# Altium integrated library ICL_komponenty_v1.IntLib: 293 symbols (part 1 of 2)
Pins are listed as number, name and electrical type; pins without a type are passive.

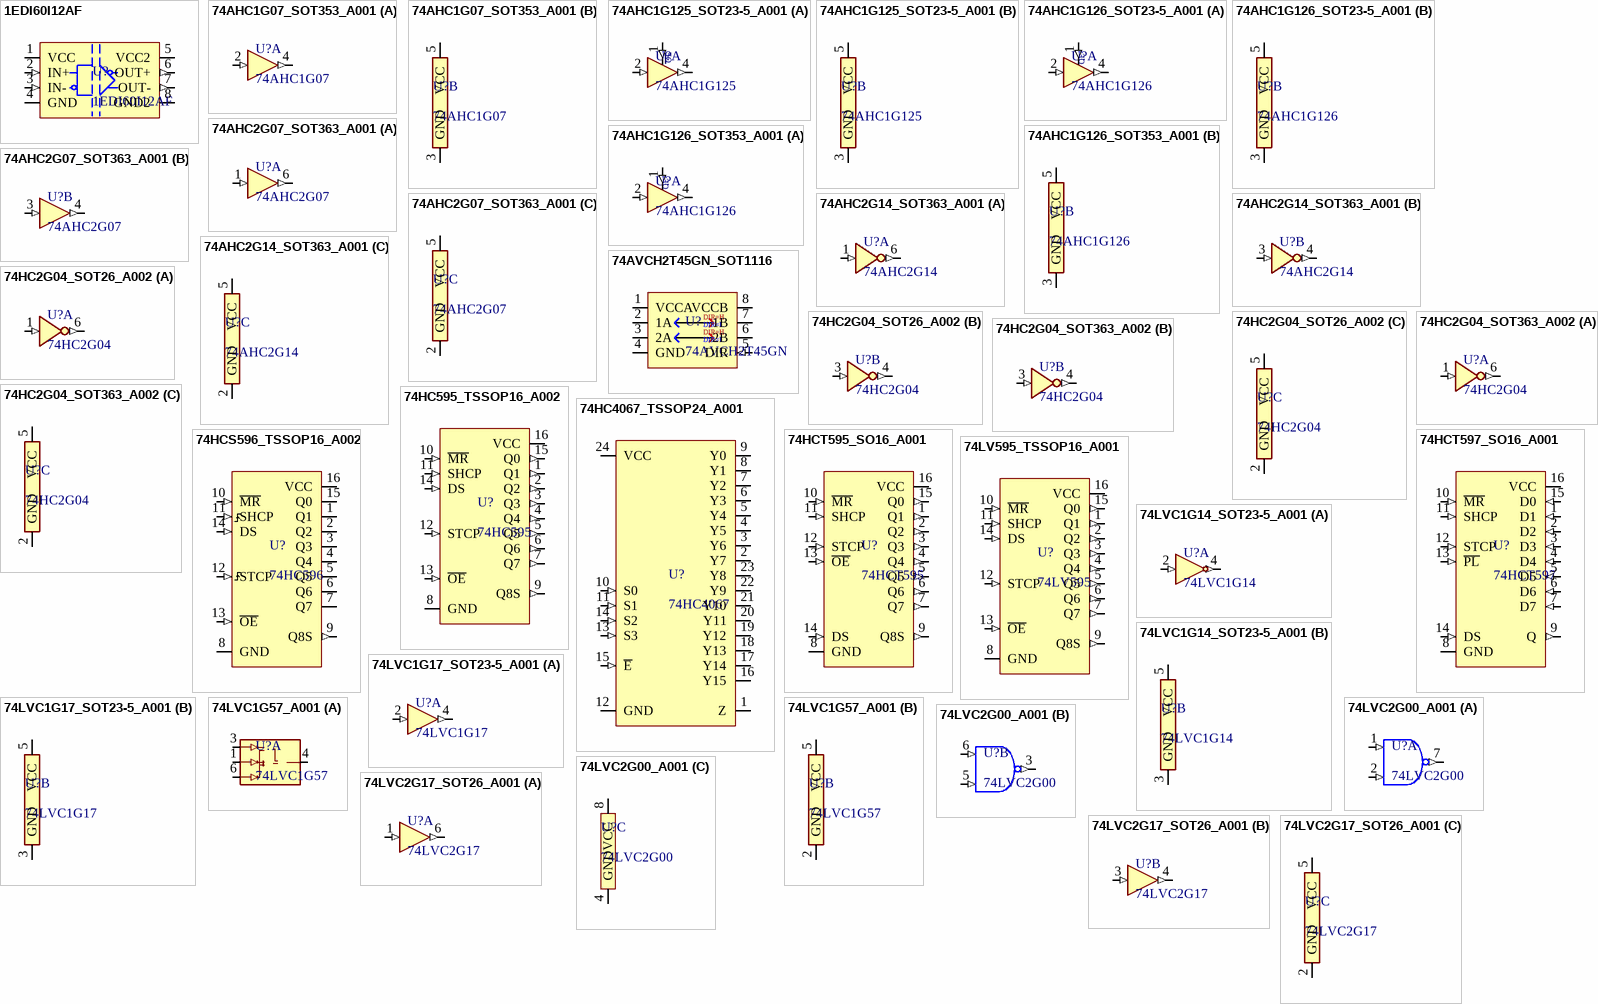
[diagram p0: symbols 1EDI60I12AF to 74LVC2G17_SOT26_A001]

## 1EDI60I12AF
designator U?
Isolated gate driver 6A; ICLN: IC_1EDI60I12AF_SO8_A001
footprint SO-8
pins: 1 VCC (power), 2 IN+ (in), 3 IN- (in), 4 GND (power), 5 VCC2 (power), 6 OUT+ (out), 7 OUT- (out), 8 GND2 (power)

## 74AHC1G07_SOT353_A001
designator U?, comment 74AHC1G07
buffer OC; ITSN: IC_74AHC1G126_SOT353_A001
footprint SOT353
part A pins: 2 A1 (in), 4 Y1 (out)
part B pins: 3 GND (power), 5 VCC (power)

## 74AHC1G125_SOT23-5_A001
designator U?, comment 74AHC1G125
buffer with enable; ICLN: IC_74AHC1G125_SOT23-5_A001
footprint SOT-23-5
part A pins: 1 OE (in), 2 A1 (in), 4 Y1 (out)
part B pins: 3 GND (power), 5 VCC (power)

## 74AHC1G126_SOT23-5_A001
designator U?, comment 74AHC1G126
buffer with enable; ICLN: IC_74AHC1G126_SOT23-5_A001
footprint SOT-23-5
part A pins: 1 OE (in), 2 A1 (in), 4 Y1 (out)
part B pins: 3 GND (power), 5 VCC (power)

## 74AHC1G126_SOT353_A001
designator U?, comment 74AHC1G126
buffer with enable; ITSN: IC_74AHC1G126_SOT353_A001
footprint SOT353
part A pins: 1 OE (in), 2 A1 (in), 4 Y1 (out)
part B pins: 3 GND (power), 5 VCC (power)

## 74AHC2G07_SOT363_A001
designator U?, comment 74AHC2G07
2x buffer OC; ITSN: IC_74AHC2G07_SOT363_A001
footprint SOT363
part A pins: 1 A1 (in), 6 Y1 (out)
part B pins: 3 A2 (in), 4 Y2 (out)
part C pins: 2 GND (power), 5 VCC (power)

## 74AHC2G14_SOT363_A001
designator U?, comment 74AHC2G14
2x inventer; ICLN: IC_74AHC2G14_SOT363_A001
footprint SOT363
part A pins: 1 A1 (in), 6 Y1 (out)
part B pins: 3 A2 (in), 4 Y2 (out)
part C pins: 2 GND (power), 5 VCC (power)

## 74AVCH2T45GN_SOT1116
designator U?, comment 74AVCH2T45GN
2 bit translator; ICLN: IC_74AVCH2T45GN_SOT1116_A001
footprint SOT-1116 (NXP SOT 1116)
pins: 1 VCCA (power), 2 1A (io), 3 2A (io), 4 GND (power), 5 DIR (in), 6 2B (io), 7 1B (io), 8 VCCB (power)
text: DIR=H; DIR=L

## 74HC2G04_SOT26_A002
designator U?, comment 74HC2G04
dual inverter; ICLN: IC_74HC2G04_SOT26_A002
footprint SOT23-6 (Zetex)
part A pins: 1 A1 (in), 6 Y1 (out)
part B pins: 3 A2 (in), 4 Y2 (out)
part C pins: 2 GND (power), 5 VCC (power)

## 74HC2G04_SOT363_A002
designator U?, comment 74HC2G04
dual inverter; ICLN: IC_74HC2G04_SOT26_A002
footprint SOT363
part A pins: 1 A1 (in), 6 Y1 (out)
part B pins: 3 A2 (in), 4 Y2 (out)
part C pins: 2 GND (power), 5 VCC (power)

## 74HC595_TSSOP16_A002
designator U?, comment 74HC595
8-b serial to parallel shift register; ICLN: IC_74HC595_TSSOP16_A002
footprint TSSOP-16
pins: 1 Q1 (out), 2 Q2 (out), 3 Q3 (out), 4 Q4 (out), 5 Q5 (out), 6 Q6 (out), 7 Q7 (out), 8 GND (power), 9 Q8S (out), 10 ~{MR} (in), 11 SHCP (in), 12 STCP (in), 13 ~{OE} (in), 14 DS (in), 15 Q0 (out), 16 VCC (power)

## 74HC4067_TSSOP24_A001
designator U?, comment 74HC4067
1:16 analog multiplekser; ICLN: IC_74HC4067_TSSOP24_A001
footprint TSSOP-24
pins: 1 Z, 2 Y7, 3 Y6, 4 Y5, 5 Y4, 6 Y3, 7 Y2, 8 Y1, 9 Y0, 10 S0 (in), 11 S1 (in), 12 GND (power), 13 S3 (in), 14 S2 (in), 15 ~{E} (in), 16 Y15, 17 Y14, 18 Y13, 19 Y12, 20 Y11, 21 Y10, 22 Y9, 23 Y8, 24 VCC (power)

## 74HCS596_TSSOP16_A002
designator U?, comment 74HC596
8-b serial to parallel shift register with open drain output; ICLN: IC_74HCS596_TSSOP16_A002
footprint TSSOP-16
pins: 1 Q1 (oc), 2 Q2 (oc), 3 Q3 (oc), 4 Q4 (oc), 5 Q5 (oc), 6 Q6 (oc), 7 Q7 (oc), 8 GND (power), 9 Q8S (out), 10 ~{MR} (in), 11 SHCP (in), 12 STCP (in), 13 ~{OE} (in), 14 DS (in), 15 Q0 (oc), 16 VCC (power)

## 74HCT595_SO16_A001
designator U?, comment 74HCT595
8-b serial to parallel shift register; ITSN: IC_74HCT595_SO16_A001
footprint SO-16 (SOIC, 16-Leads, Body 10,0x4,0mm (max), Pitch 1,27mm, IPC Low Density)
pins: 1 Q1 (out), 2 Q2 (out), 3 Q3 (out), 4 Q4 (out), 5 Q5 (out), 6 Q6 (out), 7 Q7 (out), 8 GND (power), 9 Q8S (out), 10 ~{MR} (in), 11 SHCP (in), 12 STCP (in), 13 ~{OE} (in), 14 DS (in), 15 Q0 (out), 16 VCC (power)

## 74HCT597_SO16_A001
designator U?, comment 74HCT597
8-b parallel  to serial shift register; ITSN: IC_74HCT597_SO16_A001
footprint SO-16 (SOIC, 16-Leads, Body 10,0x4,0mm (max), Pitch 1,27mm, IPC Low Density)
pins: 1 D1 (in), 2 D2 (in), 3 D3 (in), 4 D4 (in), 5 D5 (in), 6 D6 (in), 7 D7 (in), 8 GND (power), 9 Q (out), 10 ~{MR} (in), 11 SHCP (in), 12 STCP (in), 13 ~{PL} (in), 14 DS (in), 15 D0 (in), 16 VCC (power)

## 74LV595_TSSOP16_A001
designator U?, comment 74LV595
8-b serial to parallel shift register; ICLN: IC_74LV595_TSSOP16_A001
footprint TSSOP-16
pins: 1 Q1 (out), 2 Q2 (out), 3 Q3 (out), 4 Q4 (out), 5 Q5 (out), 6 Q6 (out), 7 Q7 (out), 8 GND (power), 9 Q8S (out), 10 ~{MR} (in), 11 SHCP (in), 12 STCP (in), 13 ~{OE} (in), 14 DS (in), 15 Q0 (out), 16 VCC (power)

## 74LVC1G14_SOT23-5_A001
designator U?, comment 74LVC1G14
inventer; ICLN: IC_74LVC1G14_SOT23-5_A001
footprint SOT-23-5
part A pins: 2 A1 (in), 4 Y1 (out)
part B pins: 3 GND (power), 5 VCC (power)

## 74LVC1G17_SOT23-5_A001
designator U?, comment 74LVC1G17
buffer; ICLN: IC_74LVC1G17_SOT23-5_A001
footprint SOT-23-5
part A pins: 2 A1 (in), 4 Y1 (out)
part B pins: 3 GND (power), 5 VCC (power)

## 74LVC1G57_A001
designator U?, comment 74LVC1G57
multiple function gate; ITSN: IC_74LVC1G57GW_SOT363_A001
footprint SOT363
part A pins: 1 B, 3 A, 4 Y, 6 C
part B pins: 2 GND (power), 5 VCC (power)

## 74LVC2G00_A001
designator U?, comment 74LVC2G00
MAND GATE; ITSN: IC_74LVC2G00_VSSOP-8_A001
footprint VSSOP-8
part A pins: 1 A1 (in), 2 B1 (in), 7 OUT_1 (out)
part B pins: 3 OUT_2 (out), 5 B2 (in), 6 A2 (in)
part C pins: 4 GND (power), 8 VCC (power)

## 74LVC2G17_SOT26_A001
designator U?, comment 74LVC2G17
buffer with shmitt; ITSN: IC_74LVC2G17_SOT26_A001
footprint SOT23-6 (Zetex)
part A pins: 1 A1 (in), 6 Y1 (out)
part B pins: 3 A2 (in), 4 Y2 (out)
part C pins: 2 GND (power), 5 VCC (power)

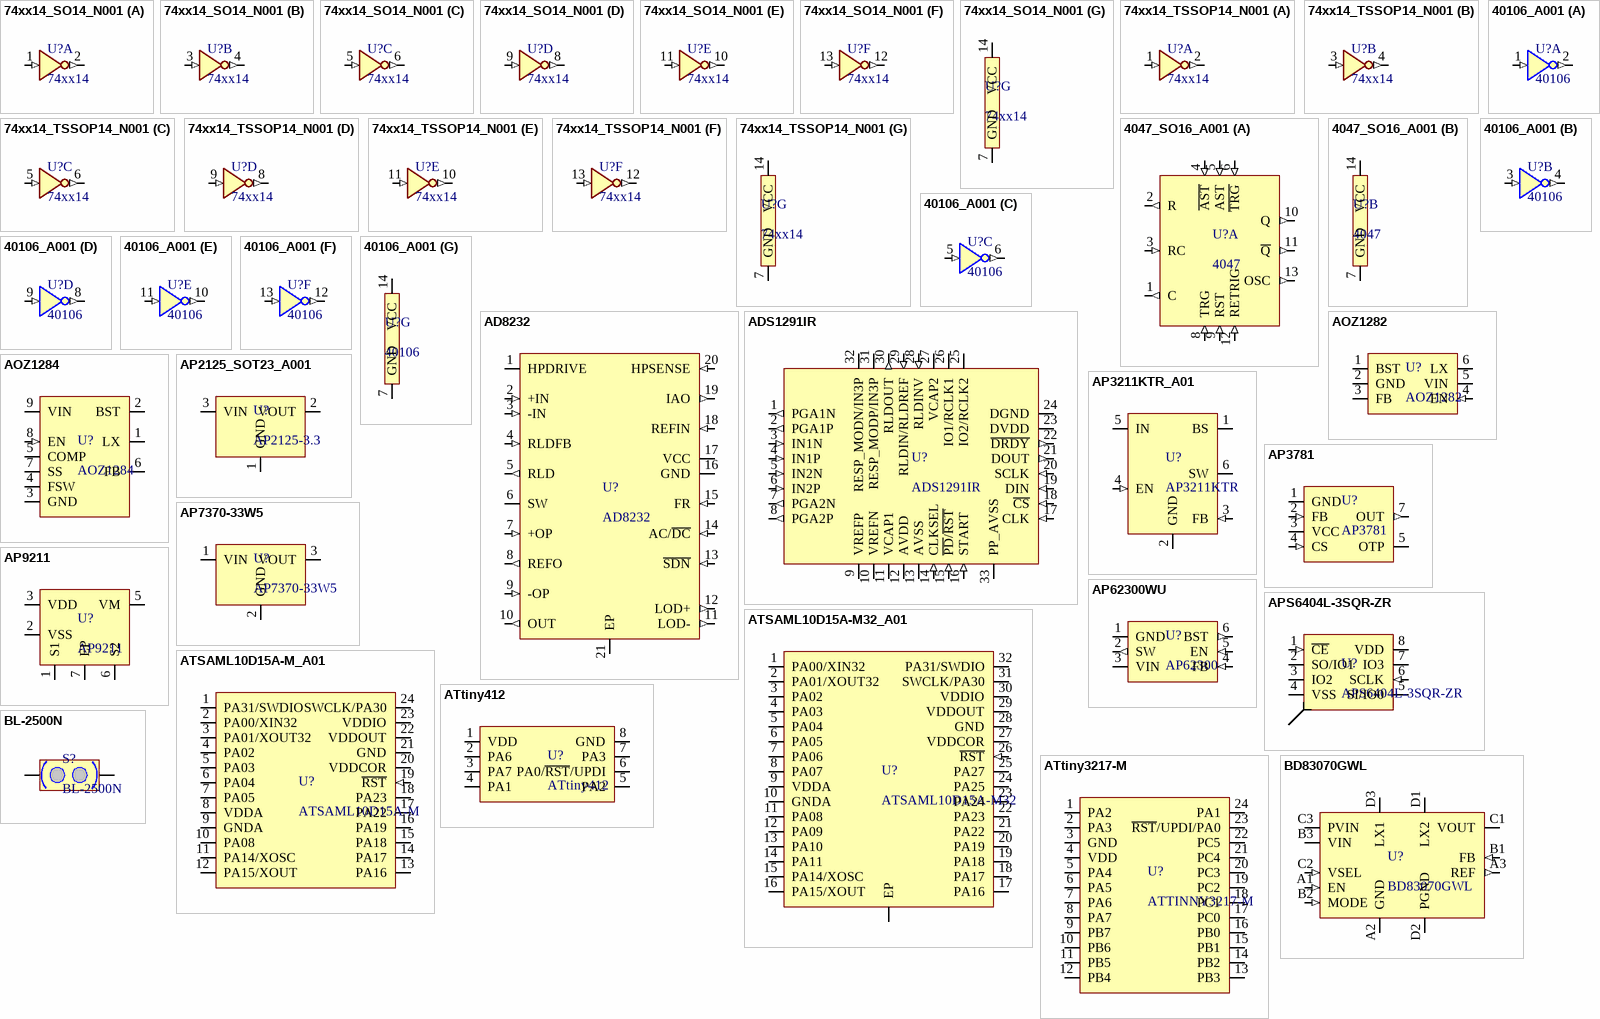
[diagram p1: symbols 74xx14_SO14_N001 to BL-2500N]

## 74xx14_SO14_N001
designator U?, comment 74xx14
6 x inverter SO14; ICLN: IC_74xx14_SO-14_N001
footprint SO-14
part A pins: 1 A1 (in), 2 ~{Y1} (out)
part B pins: 3 A2 (in), 4 ~{Y2} (out)
part C pins: 5 A3 (in), 6 ~{Y3} (out)
part D pins: 8 ~{Y4} (out), 9 A4 (in)
part E pins: 10 ~{Y5} (out), 11 A5 (in)
part F pins: 12 ~{Y6} (out), 13 A6 (in)
part G pins: 7 GND (power), 14 VCC (power)

## 74xx14_TSSOP14_N001
designator U?, comment 74xx14
6 x inverter SO14; ICLN: IC_74xx14_TSSOP-14_N001
footprint TSSOP-14
part A pins: 1 A1 (in), 2 ~{Y1} (out)
part B pins: 3 A2 (in), 4 ~{Y2} (out)
part C pins: 5 A3 (in), 6 ~{Y3} (out)
part D pins: 8 ~{Y4} (out), 9 A4 (in)
part E pins: 10 ~{Y5} (out), 11 A5 (in)
part F pins: 12 ~{Y6} (out), 13 A6 (in)
part G pins: 7 GND (power), 14 VCC (power)

## 4047_SO16_A001
designator U?, comment 4047
monostable/astable multivibrator; ICLN: 4047_SO14_A001
footprint SO-14
part A pins: 1 C (out), 2 R (out), 3 RC (in), 4 ~{AST} (in), 5 AST (in), 6 ~{TRG} (in), 8 TRG (in), 9 RST (in), 10 Q (out), 11 ~{Q} (out), 12 RETRIG (in), 13 OSC (out)
part B pins: 7 GND (power), 14 VCC (power)

## 40106_A001
designator U?, comment 40106
6 x inverter; ITSN: IC_40106_SO-16_A001
footprint SO-14
part A pins: 1 A1 (in), 2 ~{Y1} (out)
part B pins: 3 A2 (in), 4 ~{Y2} (out)
part C pins: 5 A3 (in), 6 ~{Y3} (out)
part D pins: 8 ~{Y4} (out), 9 A4 (in)
part E pins: 10 ~{Y5} (out), 11 A5 (in)
part F pins: 12 ~{Y6} (out), 13 A6 (in)
part G pins: 7 GND (power), 14 VCC (power)

## AD8232
designator U?
Single-Lead, Heart Rate Monitor Front End; ICLN: IC_AD8232ACPZ_QFN-20_A001
footprint QFN20_AD (AD8232)
pins: 1 HPDRIVE, 2 +IN (in), 3 -IN (in), 4 RLDFB (in), 5 RLD (out), 6 SW, 7 +OP (in), 8 REFO (out), 9 -OP (in), 10 OUT (out), 11 LOD- (out), 12 LOD+ (out), 13 ~{SDN} (in), 14 AC/~{DC} (in), 15 FR (in), 16 GND (power), 17 VCC (power), 18 REFIN (in), 19 IAO (out), 20 HPSENSE (in), 21 EP

## ADS1291IR
designator U?
24-Bit Analog Front-End for Biopotential Measurements; ICLN: IC_ADS1291IR_VQFN-32_A001
footprint VQFN-32 (TI VQFN 4X4 32 pin)
pins: 1 PGA1N (out), 2 PGA1P (out), 3 IN1N (in), 4 IN1P (in), 5 IN2N (in), 6 IN2P (in), 7 PGA2N (out), 8 PGA2P (out), 9 VREFP (io), 10 VREFN (io), 11 VCAP1, 12 AVDD (power), 13 AVSS (power), 14 CLKSEL (in), 15 ~{PD}/~{RST} (in), 16 START (in), 17 CLK (in), 18 ~{CS} (in), 19 DIN (in), 20 SCLK (in), 21 DOUT (out), 22 ~{DRDY} (out), 23 DVDD (power), 24 DGND (power), 25 IO2/RCLK2 (io), 26 IO1/RCLK1 (io), 27 VCAP2, 28 RLDINV (in), 29 RLDIN/RLDREF (in), 30 RLDOUT (out), 31 RESP_MODP/IN3P (io), 32 RESP_MODN/IN3P (io), 33 PP_AVSS

## AOZ1282
designator U?
DC/DC 1,2A 36V 500kHz SOT23-6; ITSN: IC_AOZ1282_SOT23-6_A001
footprint SOT23-6 (Zetex)
pins: 1 BST, 2 GND (power), 3 FB, 4 EN (in), 5 VIN (power), 6 LX

## AOZ1284
designator U?
3.0V to 36V 4A step-down; ITSN: IC_AOZ1284_SO8EP_A001
footprint SO-8T
pins: 1 LX, 2 BST, 3 GND (power), 4 FSW, 5 COMP, 6 FB, 7 SS, 8 EN (in), 9 VIN (power)

## AP2125_SOT23_A001
designator U?, comment AP2125-3.3
Multi komponent 2.2-3.3 V 100mA Iq<65uA; ITSN: IC_LIN_REG_MULTI_SOT23_A001
footprint SOT-23
pins: 1 GND (power), 2 VOUT (power), 3 VIN (power)

## AP3211KTR_A01
designator U?, comment AP3211KTR
5-18V 1A5 input buck converter; ICLN: IC_AP3211KTR_SOT23-6_A001
footprint SOT23-6 (Zetex)
pins: 1 BS, 2 GND, 3 FB (in), 4 EN (in), 5 IN, 6 SW

## AP3781
designator U?
Flayback AP3781; ICLN: IC_AP3781S_SO8_SMD_A001
footprint SO-8
pins: 1 GND (power), 2 FB (in), 3 VCC (power), 4 CS (in), 5 OTP, 7 OUT (out)

## AP7370-33W5
designator U?
ICLN: IC_AP7370-33W5_SOT23-5_A001
footprint SOT-23-5
pins: 1 VIN (power), 2 GND (power), 3 VOUT (power)

## AP9211
designator U?
single chip protection for 1-CELL Li+ battery; ITSN: IC_AP9211_UDFN-6_A001
footprint U-DFN2030-6 (DIODEC modyfied DFN-6)
pins: 1 S1, 2 VSS (power), 3 VDD (power), 5 VM, 6 S2, 7 EP

## AP62300WU
designator U?, comment AP62300
Step down synchronus  low IQ 4.2-18V 3A; ICLN: IC_AP62300WU_SOT26_A001
footprint SOT23-6 (Zetex)
pins: 1 GND (power), 2 SW (out), 3 VIN (power), 4 FB (in), 5 EN (in), 6 BST (out)

## APS6404L-3SQR-ZR
designator U?
64Mbit PSRAM; ICLN: IC_PSRAM_64Mb_USON8_A01
footprint USON-8L (3x2mm APMEMORY)
pins: 1 ~{CE} (in), 2 SO/IO1 (io), 3 IO2 (io), 4 VSS (power), 5 SI/IO0 (io), 6 SCLK (in), 7 IO3 (io), 8 VDD (power), 9 EP

## ATSAML10D15A-M32_A01
designator U?, comment ATSAML10D15A-M32
ICLN: IC_ATSAML10D15A_QFN32_A001
footprint QFN-32_A01 (ATSAML10)
pins: 1 PA00/XIN32 (io), 2 PA01/XOUT32 (io), 3 PA02 (io), 4 PA03 (io), 5 PA04 (io), 6 PA05 (io), 7 PA06 (io), 8 PA07 (io), 9 VDDA (power), 10 GNDA (power), 11 PA08 (io), 12 PA09 (io), 13 PA10 (io), 14 PA11 (io), 15 PA14/XOSC (io), 16 PA15/XOUT (io), 17 PA16 (io), 18 PA17 (io), 19 PA18 (io), 20 PA19 (io), 21 PA22 (io), 22 PA23 (io), 23 PA24 (io), 24 PA25 (io), 25 PA27 (io), 26 ~{RST} (in), 27 VDDCOR (power), 28 GND (power), 29 VDDOUT (power), 30 VDDIO (power), 31 SWCLK/PA30 (io), 32 PA31/SWDIO (io), 33 EP

## ATSAML10D15A-M_A01
designator U?, comment ATSAML10D15A-M
ICLN: IC_ATSAML10D15A_QFN24_A001
footprint QFN24_4_4 (QFN, 24-Leads, Body 4,00x4,00mm, Pitch 0,50mm, Thermal Pad 2,60x2,60mm, IPC Medium Density)
pins: 1 PA31/SWDIO (io), 2 PA00/XIN32 (io), 3 PA01/XOUT32 (io), 4 PA02 (io), 5 PA03 (io), 6 PA04 (io), 7 PA05 (io), 8 VDDA (power), 9 GNDA (power), 10 PA08 (io), 11 PA14/XOSC (io), 12 PA15/XOUT (io), 13 PA16 (io), 14 PA17 (io), 15 PA18 (io), 16 PA19 (io), 17 PA22 (io), 18 PA23 (io), 19 ~{RST} (in), 20 VDDCOR (power), 21 GND (power), 22 VDDOUT (power), 23 VDDIO (power), 24 SWCLK/PA30 (io)

## ATtiny412
designator U?
tinyAVR 1-series 4k/256 8pin; ITSN: IC_ATTINY412_A001
footprint SO-8
pins: 1 VDD (power), 2 PA6 (io), 3 PA7 (io), 4 PA1 (io), 5 PA2 (io), 6 PA0/~{RST}/UPDI (io), 7 PA3 (io), 8 GND (power)

## ATtiny3217-M
designator U?, comment ATTINNY3217-M
32k/2k
footprint QFN24_4_4 (QFN, 24-Leads, Body 4,00x4,00mm, Pitch 0,50mm, Thermal Pad 2,60x2,60mm, IPC Medium Density)
pins: 1 PA2 (io), 2 PA3 (io), 3 GND (power), 4 VDD (power), 5 PA4 (io), 6 PA5 (io), 7 PA6 (io), 8 PA7 (io), 9 PB7 (io), 10 PB6 (io), 11 PB5 (io), 12 PB4 (io), 13 PB3 (io), 14 PB2 (io), 15 PB1 (io), 16 PB0 (io), 17 PC0 (io), 18 PC1 (io), 19 PC2 (io), 20 PC3 (io), 21 PC4 (io), 22 PC5 (io), 23 ~{RST}/UPDI/PA0 (io), 24 PA1 (io)

## BD83070GWL
designator U?
Synchronous Buck-Boost; low IQ; 2-5V / 1A; ICLN: IC_BD83070GWL_BGA12_A001
footprint BD83070GWL (BGA)
pins: A1 EN (in), A2 GND (power), A3 REF (out), B1 FB (in), B2 MODE (in), B3 VIN (power), C1 VOUT (power), C2 VSEL (in), C3 PVIN (power), D1 LX2, D2 PGND (power), D3 LX1

## BL-2500N
designator S?
vibration switch; ICLN: nn
footprint BL-2500N (vibration sensor)
pins: 1 A, 2 B

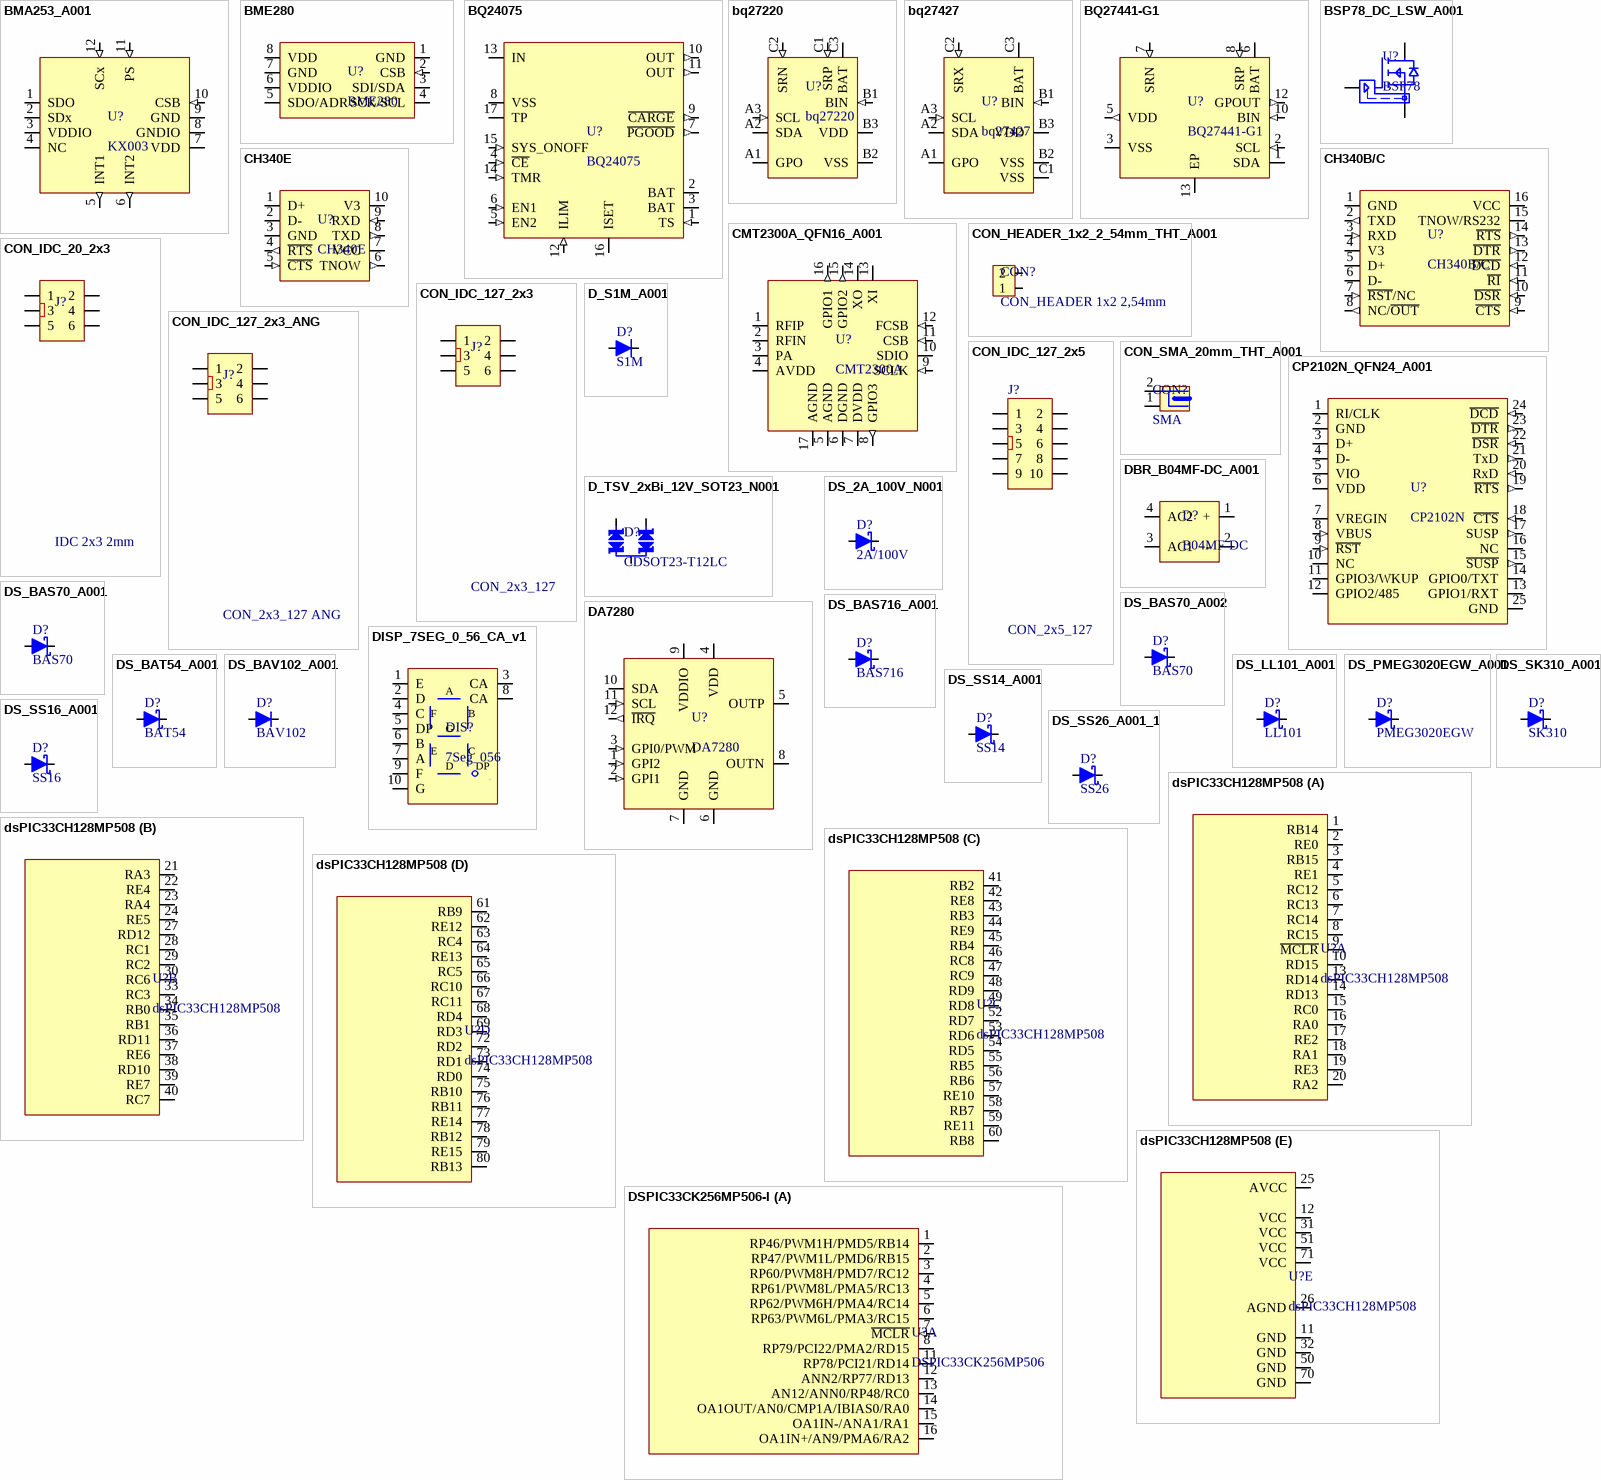
[diagram p2: symbols BMA253_A001 to DSPIC33CK256MP506-I]

## BMA253_A001
designator U?, comment KX003
KX003-1077
footprint LGA-12_ACC_BOSCH (LGA, 12-Leads, Body 2,00x2,00mmx0,70mm, Pitch 0,50mm)
pins: 1 SDO (io), 2 SDx (io), 3 VDDIO, 4 NC, 5 INT1 (out), 6 INT2 (out), 7 VDD (power), 8 GNDIO (power), 9 GND (power), 10 CSB (in), 11 PS (in), 12 SCx (in)

## BME280
designator U?
BME280 BOSCH, humidity, pressure and temperature sensor.; ITSN: IC_BME280_LGA8_A001
footprint LGA_8 (BME280 bosh)
pins: 1 GND (power), 2 CSB (in), 3 SDI/SDA (io), 4 SCK/SCL (io), 5 SDO/ADR (io), 6 VDDIO (power), 7 GND (power), 8 VDD (power)

## BQ24075
designator U?
1-Cell 1.5-A Linear Battery Chargers with Power Path; ICLN: IC_BQ24075_QFN16_A001
footprint QFN_16_3x3_A001 (CMOSTEK)
pins: 1 TS (in), 2 BAT (power), 3 BAT (power), 4 ~{CE} (in), 5 EN2 (in), 6 EN1 (in), 7 ~{PGOOD} (out), 8 VSS (power), 9 ~{CARGE} (out), 10 OUT (out), 11 OUT (out), 12 ILIM (in), 13 IN (power), 14 TMR (in), 15 SYS_ONOFF (in), 16 ISET (io), 17 TP

## bq27220
designator U?
Single-Cell CEDV Fuel Gauge; ICLN: IC_BQ27220_BGA_A01
footprint DSBGA-9 (0,5x0,5 mm BGA TI)
pins: A1 GPO (oc), A2 SDA (oc), A3 SCL (in), B1 BIN (in), B2 VSS (power), B3 VDD (power), C1 SRP (in), C2 SRN (in), C3 BAT

## bq27427
designator U?
Single-Cell CEDV Fuel Gauge; ICLN: IC_BQ27427_BGA_A01
footprint DSBGA-9 (0,5x0,5 mm BGA TI)
pins: A1 GPO (oc), A2 SDA (oc), A3 SCL (in), B1 BIN (in), B2 VSS (power), B3 VDD (power), C1 VSS (power), C2 SRX (in), C3 BAT

## BQ27441-G1
designator U?
System-Side Impedance Track™ Fuel Gauge; ICLN: IC_BQ27441-G1_VSON12_A001
footprint VSON_12 (TI VSON 12 PACKAGE)
pins: 1 SDA (io), 2 SCL (in), 3 VSS (power), 5 VDD (out), 6 BAT, 7 SRN (in), 8 SRP (in), 10 BIN (in), 12 GPOUT (out), 13 EP

## BSP78_DC_LSW_A001
designator U?, comment BSP78
Low side protected MOSFET; ITSN: IC_BSP78_SOT223_A001
footprint SOT-223
pins: 1 G, 2 D, 3 S

## CH340B/C
designator U?
CHINESS usb to usart conventer; ICLN: IC_CH340B/C_SO16_N001
footprint SO-16 (SOIC, 16-Leads, Body 10,0x4,0mm (max), Pitch 1,27mm, IPC Low Density)
pins: 1 GND (power), 2 TXD (out), 3 RXD (in), 4 V3 (power), 5 D+ (io), 6 D- (io), 7 ~{RST}/NC (in), 8 NC/~{OUT} (out), 9 ~{CTS} (in), 10 ~{DSR} (in), 11 ~{RI} (in), 12 ~{DCD} (in), 13 ~{DTR} (out), 14 ~{RTS} (out), 15 TNOW/RS232 (io), 16 VCC (power)

## CH340E
designator U?
CHINESS usb to usart conventer; ICLN: IC_CH340E_MSOP-10_A001
footprint MSOP-10-WCH
pins: 1 D+ (io), 2 D- (io), 3 GND (power), 4 ~{RTS} (out), 5 ~{CTS} (in), 6 TNOW (out), 7 VCC (power), 8 TXD (out), 9 RXD (in), 10 V3 (power)

## CMT2300A_QFN16_A001
designator U?, comment CMT2300A
RF Transciver sub Giga CEMOSTEK CMT2300A QFN16; ICLN: IC_CMT2300A_QFN16_A001
footprint QFN_16_3x3_A001 (CMOSTEK)
pins: 1 RFIP, 2 RFIN, 3 PA, 4 AVDD (power), 5 AGND (power), 6 DGND (power), 7 DVDD (power), 8 GPIO3 (out), 9 SCLK (in), 10 SDIO (io), 11 CSB (in), 12 FCSB (in), 13 XI, 14 XO, 15 GPIO2 (out), 16 GPIO1 (out), 17 AGND (power)

## CON_HEADER_1x2_2_54mm_THT_A001
designator CON?, comment CON_HEADER 1x2 2,54mm
footprint CON_HEADER_1x2_2.54_THT_A001
pins: 1, 2

## CON_IDC_20_2x3
designator J?, comment IDC 2x3 2mm
IDC THT 2mm 2x3
footprint IDC_2_0_2x3_THT (IDC 2x3 2mm THT)
pins: 1, 2, 3, 4, 5, 6

## CON_IDC_127_2x3
designator J?, comment CON_2x3_127
Connector
footprint IDC_1_27_2x3_SMT (IDC 2x3 1,27 mm SMT OEM)
pins: 1, 2, 3, 4, 5, 6

## CON_IDC_127_2x3_ANG
designator J?, comment CON_2x3_127 ANG
Connector 1,27mm ANG
footprint IDC_1_27_2x3_THT_angle (IDC 2x3 1,27 mm THT angle)
pins: 1, 2, 3, 4, 5, 6

## CON_IDC_127_2x5
designator J?, comment CON_2x5_127
Connector
footprint IDC_1_27_2x5_SMT (IDC 2x5 1,27 mm SMT OEM)
pins: 1, 2, 3, 4, 5, 6, 7, 8, 9, 10

## CON_SMA_20mm_THT_A001
designator CON?, comment SMA
ITSN: CON_SMA_20mm_THT_A001
footprint SMA_THT_20mm_A001
pins: 1, 2

## CP2102N_QFN24_A001
designator U?, comment CP2102N
USB 2 RS; ICLN: IC_CP2102N_QFN24_A001
footprint QFN24_4_4 (QFN, 24-Leads, Body 4,00x4,00mm, Pitch 0,50mm, Thermal Pad 2,60x2,60mm, IPC Medium Density)
pins: 1 RI/CLK (io), 2 GND (power), 3 D+, 4 D-, 5 VIO, 6 VDD (power), 7 VREGIN, 8 VBUS (in), 9 ~{RST} (in), 10 NC, 11 GPIO3/WKUP (io), 12 GPIO2/485 (io), 13 GPIO1/RXT (io), 14 GPIO0/TXT (io), 15 ~{SUSP} (out), 16 NC, 17 SUSP (out), 18 ~{CTS} (in), 19 ~{RTS} (out), 20 RxD (in), 21 TxD (out), 22 ~{DSR} (in), 23 ~{DTR} (out), 24 ~{DCD} (in), 25 GND (power)

## D_S1M_A001
designator D?, comment S1M
S1M 1kV 1A DO214AC (SMA); ICLN: D_1kV_1A_S1M_SMD_A001
footprint DO214AC
pins: 1 A, 2 K

## D_TSV_2xBi_12V_SOT23_N001
designator D?, comment CDSOT23-T12LC
12V Dual Line TVS Diode; ICLN: D_TSV_2xBi_12V_SOT23_N001
footprint SOT-23
pins: 1 K, 2 K, 3 CA

## DA7280
designator U?
LRA/ERM Haptic Driver; ICLN: IC_DA7280_QFN_A001
footprint QFN12_RENESAS_A01
pins: 1 GPI2 (in), 2 GPI1 (in), 3 GPI0/PWM (in), 4 VDD (power), 5 OUTP, 6 GND (power), 7 GND (power), 8 OUTN, 9 VDDIO (power), 10 SDA (io), 11 SCL (in), 12 ~{IRQ} (out)

## DBR_B04MF-DC_A001
designator D?, comment B04MF-DC
1kV/0.4A SMD; ICLN: DBR_B04MF_SMD_A001
footprint MBFL (Bridge rectifier)
pins: 1 +, 2 -, 3 AC1, 4 AC2

## DISP_7SEG_0_56_CA_v1
designator DIS?, comment 7Seg_056
LED display CA; ICLN: DISP_7SEG_nn
footprint DISP_7SEG_0_56_CA_v1
pins: 1 E, 2 D, 3 CA, 4 C, 5 DP, 6 B, 7 A, 8 CA, 9 F, 10 G

## DS_2A_100V_N001
designator D?, comment 2A/100V
Schottky 100V 2A DO214AA; ICLN: DS_2A_100V_DO214AA_N001
footprint DO214AA
pins: 1 A, 2 K

## DS_BAS70_A001
designator D?, comment BAS70
BAS70 Schottky switching diode single, 70mA 70V; ICLN: DS_BAS70_SOD-523_A001
footprint SOD-523
pins: 1 A, 2 K

## DS_BAS70_A002
designator D?, comment BAS70
BAS70 Schottky switching diode single, 70mA 70V; ICLN: DS_BAS70_SOD-323_A001
footprint SOD-323
pins: 1 A, 2 K

## DS_BAS716_A001
designator D?, comment BAS716
BAS716 low-leakage diode single, 0,2A 75V; ITSN: DS_BAS716_SOD523_A001
footprint SOD-523
pins: 1 A, 2 K

## DS_BAT54_A001
designator D?, comment BAT54
BAT54 Schottky diode single, 0,2A 30V; ICLN: DS_BAT54_SOD523_A001
footprint SOD-523
pins: 1 A, 2 K

## DS_BAV102_A001
designator D?, comment BAV102
BAV102 switching diode 50ns 200V 0,25A; ITSN: DS_BAV102_SOD-80_A001
footprint SOD-80 (miniMELF)
pins: 1 A, 2 K

## DS_LL101_A001
designator D?, comment LL101
LL101 Schottky diode switch 1ns, 15mA 40V; ITSN: DS_LL101_SOD-80_A001
footprint SOD-80 (miniMELF)
pins: 1 A, 2 K

## DS_PMEG3020EGW_A001
designator D?, comment PMEG3020EGW
Schottky switching diode single, 2A 30V; ICLN: DS_PMEG3020EGW_SOD-123_A001
footprint SOD-123
pins: 1 A, 2 K

## DS_SK310_A001
designator D?, comment SK310
SK310 Schottky 100V 3A DO214AC (SMA); ICLN: DS_SK310_3A_100V_DO214AC_A001
footprint DO214AC
pins: 1 A, 2 K

## DS_SS14_A001
designator D?, comment SS14
SS14 Schottky 40V 1A DO214AC (SMA); ITSN: DS_SS14_1A_40V_DO214AC_A001
footprint DO214AC
pins: 1 A, 2 K

## DS_SS16_A001
designator D?, comment SS16
SS16 Schottky 60V 1A DO214AC (SMA); ITSN: DS_SS16_1A_60V_DO214AC_A001
footprint DO214AC
pins: 1 A, 2 K

## DS_SS26_A001_1
designator D?, comment SS26
SS26 Schottky 60V 2A SOD123; ICLN: DS_SS26_SOD123_A001
footprint SOD-123
pins: 1 A, 2 K

## dsPIC33CH128MP508
designator U?
ICLN: IC_DSPIC33CH128MP508_A001
footprint LQFP-80 (TSQFP, 80-Leads, Body 12.00x12.00mm, Pitch 0.50mm, IPC Low Density)
part A pins: 1 RB14 (io), 2 RE0 (io), 3 RB15 (io), 4 RE1 (io), 5 RC12 (io), 6 RC13 (io), 7 RC14 (io), 8 RC15 (io), 9 ~{MCLR} (io), 10 RD15 (io), 13 RD14 (io), 14 RD13 (io), 15 RC0 (io), 16 RA0 (io), 17 RE2 (io), 18 RA1 (io), 19 RE3 (io), 20 RA2 (io)
part B pins: 21 RA3 (io), 22 RE4 (io), 23 RA4 (io), 24 RE5 (io), 27 RD12 (io), 28 RC1 (io), 29 RC2 (io), 30 RC6 (io), 33 RC3 (io), 34 RB0 (io), 35 RB1 (io), 36 RD11 (io), 37 RE6 (io), 38 RD10 (io), 39 RE7 (io), 40 RC7 (io)
part C pins: 41 RB2 (io), 42 RE8 (io), 43 RB3 (io), 44 RE9 (io), 45 RB4 (io), 46 RC8 (io), 47 RC9 (io), 48 RD9 (io), 49 RD8 (io), 52 RD7 (io), 53 RD6 (io), 54 RD5 (io), 55 RB5 (io), 56 RB6 (io), 57 RE10 (io), 58 RB7 (io), 59 RE11 (io), 60 RB8 (io)
part D pins: 61 RB9 (io), 62 RE12 (io), 63 RC4 (io), 64 RE13 (io), 65 RC5 (io), 66 RC10 (io), 67 RC11 (io), 68 RD4 (io), 69 RD3 (io), 72 RD2 (io), 73 RD1 (io), 74 RD0 (io), 75 RB10 (io), 76 RB11 (io), 77 RE14 (io), 78 RB12 (io), 79 RE15 (io), 80 RB13 (io)
part E pins: 11 GND (power), 12 VCC (power), 25 AVCC (power), 26 AGND (power), 31 VCC (power), 32 GND (power), 50 GND (power), 51 VCC (power), 70 GND (power), 71 VCC (power)

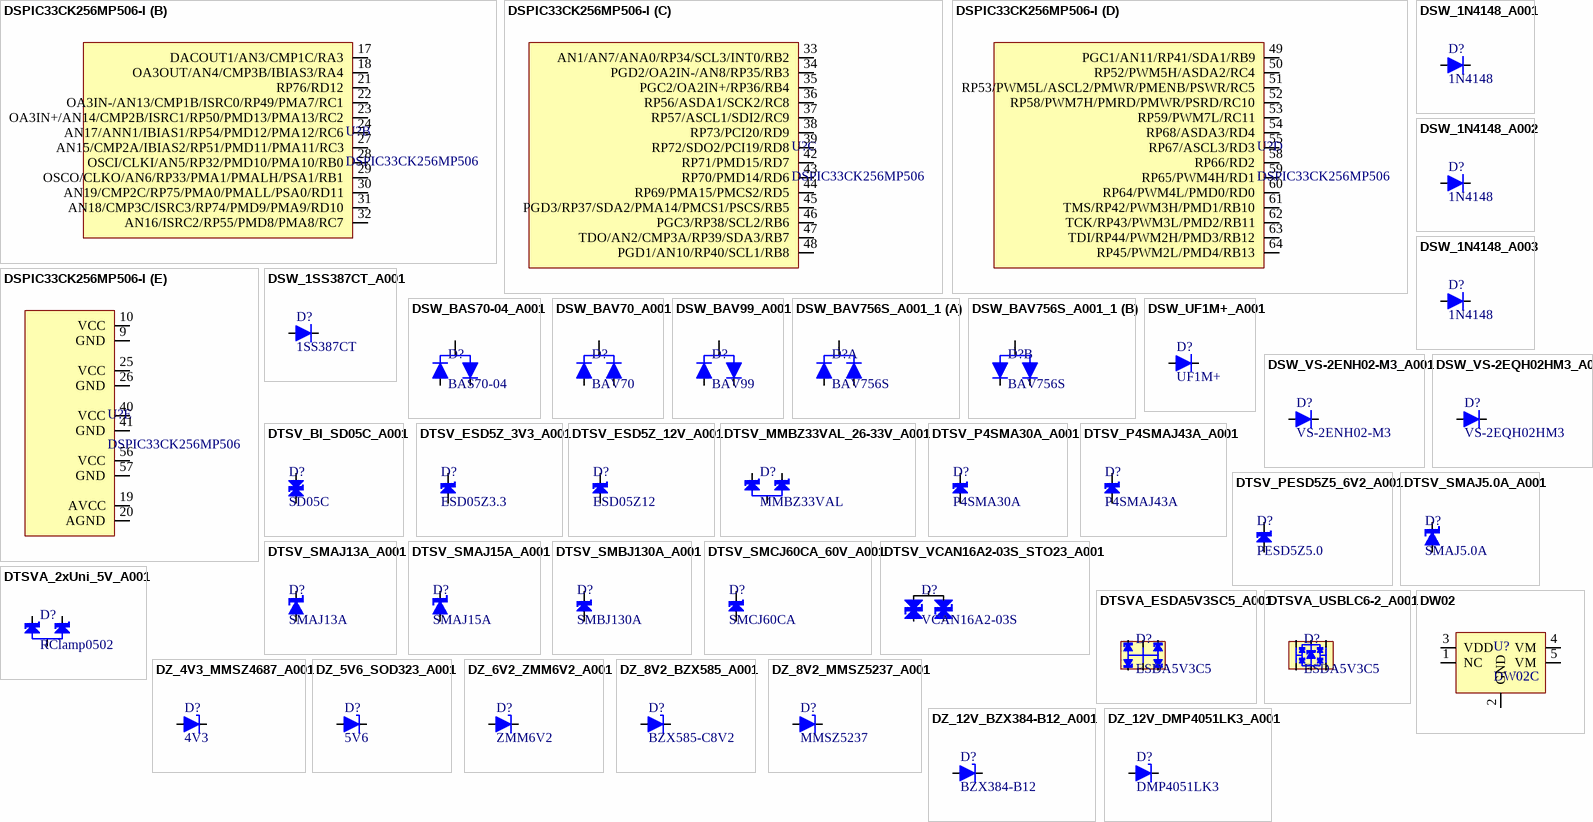
[diagram p3: symbols DSPIC33CK256MP506-I to DZ_12V_DMP4051LK3_A001]

## DSPIC33CK256MP506-I
designator U?, comment DSPIC33CK256MP506
ICLN: IC_DSPIC33CK256MP506_TQFP64_A001
footprint LQFP64_small (TSQFP, 64-Leads, Body 10,00x10,00mm, Pitch 0,50mm)
part A pins: 1 RP46/PWM1H/PMD5/RB14 (io), 2 RP47/PWM1L/PMD6/RB15 (io), 3 RP60/PWM8H/PMD7/RC12 (io), 4 RP61/PWM8L/PMA5/RC13 (io), 5 RP62/PWM6H/PMA4/RC14 (io), 6 RP63/PWM6L/PMA3/RC15 (io), 7 ~{MCLR} (in), 8 RP79/PCI22/PMA2/RD15 (io), 11 RP78/PCI21/RD14 (io), 12 ANN2/RP77/RD13 (io), 13 AN12/ANN0/RP48/RC0 (io), 14 OA1OUT/AN0/CMP1A/IBIAS0/RA0 (io), 15 OA1IN-/ANA1/RA1 (io), 16 OA1IN+/AN9/PMA6/RA2 (io)
part B pins: 17 DACOUT1/AN3/CMP1C/RA3 (io), 18 OA3OUT/AN4/CMP3B/IBIAS3/RA4 (io), 21 RP76/RD12 (io), 22 OA3IN-/AN13/CMP1B/ISRC0/RP49/PMA7/RC1 (io), 23 OA3IN+/AN14/CMP2B/ISRC1/RP50/PMD13/PMA13/RC2 (io), 24 AN17/ANN1/IBIAS1/RP54/PMD12/PMA12/RC6 (io), 27 AN15/CMP2A/IBIAS2/RP51/PMD11/PMA11/RC3 (io), 28 OSCI/CLKI/AN5/RP32/PMD10/PMA10/RB0 (io), 29 OSCO/CLKO/AN6/RP33/PMA1/PMALH/PSA1/RB1 (io), 30 AN19/CMP2C/RP75/PMA0/PMALL/PSA0/RD11 (io), 31 AN18/CMP3C/ISRC3/RP74/PMD9/PMA9/RD10 (io), 32 AN16/ISRC2/RP55/PMD8/PMA8/RC7 (io)
part C pins: 33 AN1/AN7/ANA0/RP34/SCL3/INT0/RB2 (io), 34 PGD2/OA2IN-/AN8/RP35/RB3 (io), 35 PGC2/OA2IN+/RP36/RB4 (io), 36 RP56/ASDA1/SCK2/RC8 (io), 37 RP57/ASCL1/SDI2/RC9 (io), 38 RP73/PCI20/RD9 (io), 39 RP72/SDO2/PCI19/RD8 (io), 42 RP71/PMD15/RD7 (io), 43 RP70/PMD14/RD6 (io), 44 RP69/PMA15/PMCS2/RD5 (io), 45 PGD3/RP37/SDA2/PMA14/PMCS1/PSCS/RB5 (io), 46 PGC3/RP38/SCL2/RB6 (io), 47 TDO/AN2/CMP3A/RP39/SDA3/RB7 (io), 48 PGD1/AN10/RP40/SCL1/RB8 (io)
part D pins: 49 PGC1/AN11/RP41/SDA1/RB9 (io), 50 RP52/PWM5H/ASDA2/RC4 (io), 51 RP53/PWM5L/ASCL2/PMWR/PMENB/PSWR/RC5 (io), 52 RP58/PWM7H/PMRD/PMWR/PSRD/RC10 (io), 53 RP59/PWM7L/RC11 (io), 54 RP68/ASDA3/RD4 (io), 55 RP67/ASCL3/RD3 (io), 58 RP66/RD2 (io), 59 RP65/PWM4H/RD1 (io), 60 RP64/PWM4L/PMD0/RD0 (io), 61 TMS/RP42/PWM3H/PMD1/RB10 (io), 62 TCK/RP43/PWM3L/PMD2/RB11 (io), 63 TDI/RP44/PWM2H/PMD3/RB12 (io), 64 RP45/PWM2L/PMD4/RB13 (io)
part E pins: 9 GND (power), 10 VCC (power), 19 AVCC (power), 20 AGND (power), 25 VCC (power), 26 GND (power), 40 VCC (power), 41 GND (power), 56 VCC (power), 57 GND (power)

## DSW_1N4148_A001
designator D?, comment 1N4148
1N4148 75V 150mA; ICLN: DSW_1N4148_SOD523_A001
footprint SOD-523 (SC-79)
pins: 1 A, 2 K

## DSW_1N4148_A002
designator D?, comment 1N4148
1N4148 75V 150mA; ITSN: DSW_1N4148_MicroMELF_A001
footprint microMELF (MELF Diode, 2-Leads, Body 1,90x1,15mm, IPC Medium Density)
pins: 1 A, 2 K

## DSW_1N4148_A003
designator D?, comment 1N4148
1N4148 75V 150mA 4ns; ICLN: DSW_1N4148_SOD323_A003
footprint SOD-323
pins: 1 A, 2 K

## DSW_1SS387CT_A001
designator D?, comment 1SS387CT
1SS387CT 85V 100mA 1,6ns 0,5pF; ITSN: DSW_1SS387CT_80V_0A2_SOD-882_A001
footprint SOD-882
pins: 1 A, 2 K

## DSW_BAS70-04_A001
designator D?, comment BAS70-04
schottky diode 70V 100mA 4ns; ICLN: DSW_BAS70-04_SOT23_A002
footprint SOT-23
pins: 1 A, 2 K, 3

## DSW_BAV70_A001
designator D?, comment BAV70
switching diode BAV70 100V 200mA 4ns; ITSN: DSW_BAV70_100V_0A2_SOT23_A001
footprint SOT-23
pins: 1 A1, 2 A2, 3

## DSW_BAV99_A001
designator D?, comment BAV99
switching diode BAV99 100V 200mA 4ns; ICLN: DSW_BAV99_100V_0A2_SOT23_A001
footprint SOT-23
pins: 1 A, 2 K, 3

## DSW_BAV756S_A001_1
designator D?, comment BAV756S
switching diode BAV756S 90V 250mA 4ns; ICLN: NN
footprint SOT363
part A pins: 1 A1, 5 A2, 6 K1
part B pins: 2 K1, 3 CA2, 4 K2

## DSW_UF1M+_A001
designator D?, comment UF1M+
fast swithing  rectifier 75ns 1kV 1A; ICLN: DSW_UF1M+_1kV_1A_DO214AC_A001
footprint DO214AC
pins: 1 A, 2 K

## DSW_VS-2ENH02-M3_A001
designator D?, comment VS-2ENH02-M3
VS-2ENH02-M3 200V 2A ultrafast switching; ICLN: DSW_VS-2ENH02-M3_A001
footprint DO220AA
pins: 1 A, 2 K

## DSW_VS-2EQH02HM3_A001
designator D?, comment VS-2EQH02HM3
ultrafast swithing  rectifier 25ns 200V 2A; ICLN: DSW_VS-2EQH02HM3_200V_2A_SMD_A001
footprint DO219AD
pins: 1 A, 2 K

## DTSV_BI_SD05C_A001
designator D?, comment SD05C
Single Line TVS Diode  5V; ITSN: DTSV_SD05C_BI_5V_24A_SOD-323_A001
footprint SOD-323
pins: 1, 2

## DTSV_ESD5Z_3V3_A001
designator D?, comment ESD05Z3.3
3V3 Single Line TVS Diode; ITSN: DTSV_ESD5Z3.3_3V3_11A2_SOD-523_A001
footprint SOD-523
pins: 1 A, 2 K

## DTSV_ESD5Z_12V_A001
designator D?, comment ESD05Z12
12V Single Line TVS Diode; ITSN: DTSV_ESD5Z12T1G_12V_9A_SOD-523_A001
footprint SOD-523
pins: 1 A, 2 K

## DTSV_MMBZ33VAL_26-33V_A001
designator D?, comment MMBZ33VAL
26-33V Dual Line TVS Diode; ITSN: DTSV_MMBZ33_26-33V_SOT23_A001
footprint SOT-23
pins: 1 K, 2 K, 3 CA

## DTSV_P4SMA30A_A001
designator D?, comment P4SMA30A
Single Line TVS Diode  30V 10A; ITSN: DTSV_P4SMA30A_30V_DO214AC_A001
footprint DO214AC
pins: 1 A, 2 K

## DTSV_P4SMAJ43A_A001
designator D?, comment P4SMAJ43A
Single Line TVS Diode  43V 10A; ITSN: DTSV_P4SMAJ43A_43V_DO214AC_A001
footprint DO214AC
pins: 1 A, 2 K

## DTSV_PESD5Z5_6V2_A001
designator D?, comment PESD5Z5.0
5V/6V2 Single Line TVS Diode; ICLN: DTSV_PESD5Z5_6V2_SOD-523_A001
footprint SOD-523
pins: 1 A, 2 K

## DTSV_SMAJ5.0A_A001
designator D?, comment SMAJ5.0A
Single Line TVS Diode  5V 43A; ICLN: DTSV_SMAJ5.0A_5V_DO214AC_A001
footprint DO214AC
pins: 1 A, 2 K

## DTSV_SMAJ13A_A001
designator D?, comment SMAJ13A
Single Line TVS Diode  13V 43A; ICLN: DTSV_SMAJ13A_13V_DO214AC_A001
footprint DO214AC
pins: 1 A, 2 K
